# Altium footprint library Common Components.PcbLib: 94 footprints (part 6 of 6)
Each footprint in its own frame and in the unit in brackets; x right, y up, seen from the top. Pads: shape width x height; smd on the part's side, far side on the other; paste and mask are expansions set on the pad; w line width, h text height; cw(c..) or ccw(c..) is an arc to the next point about the centre after c.
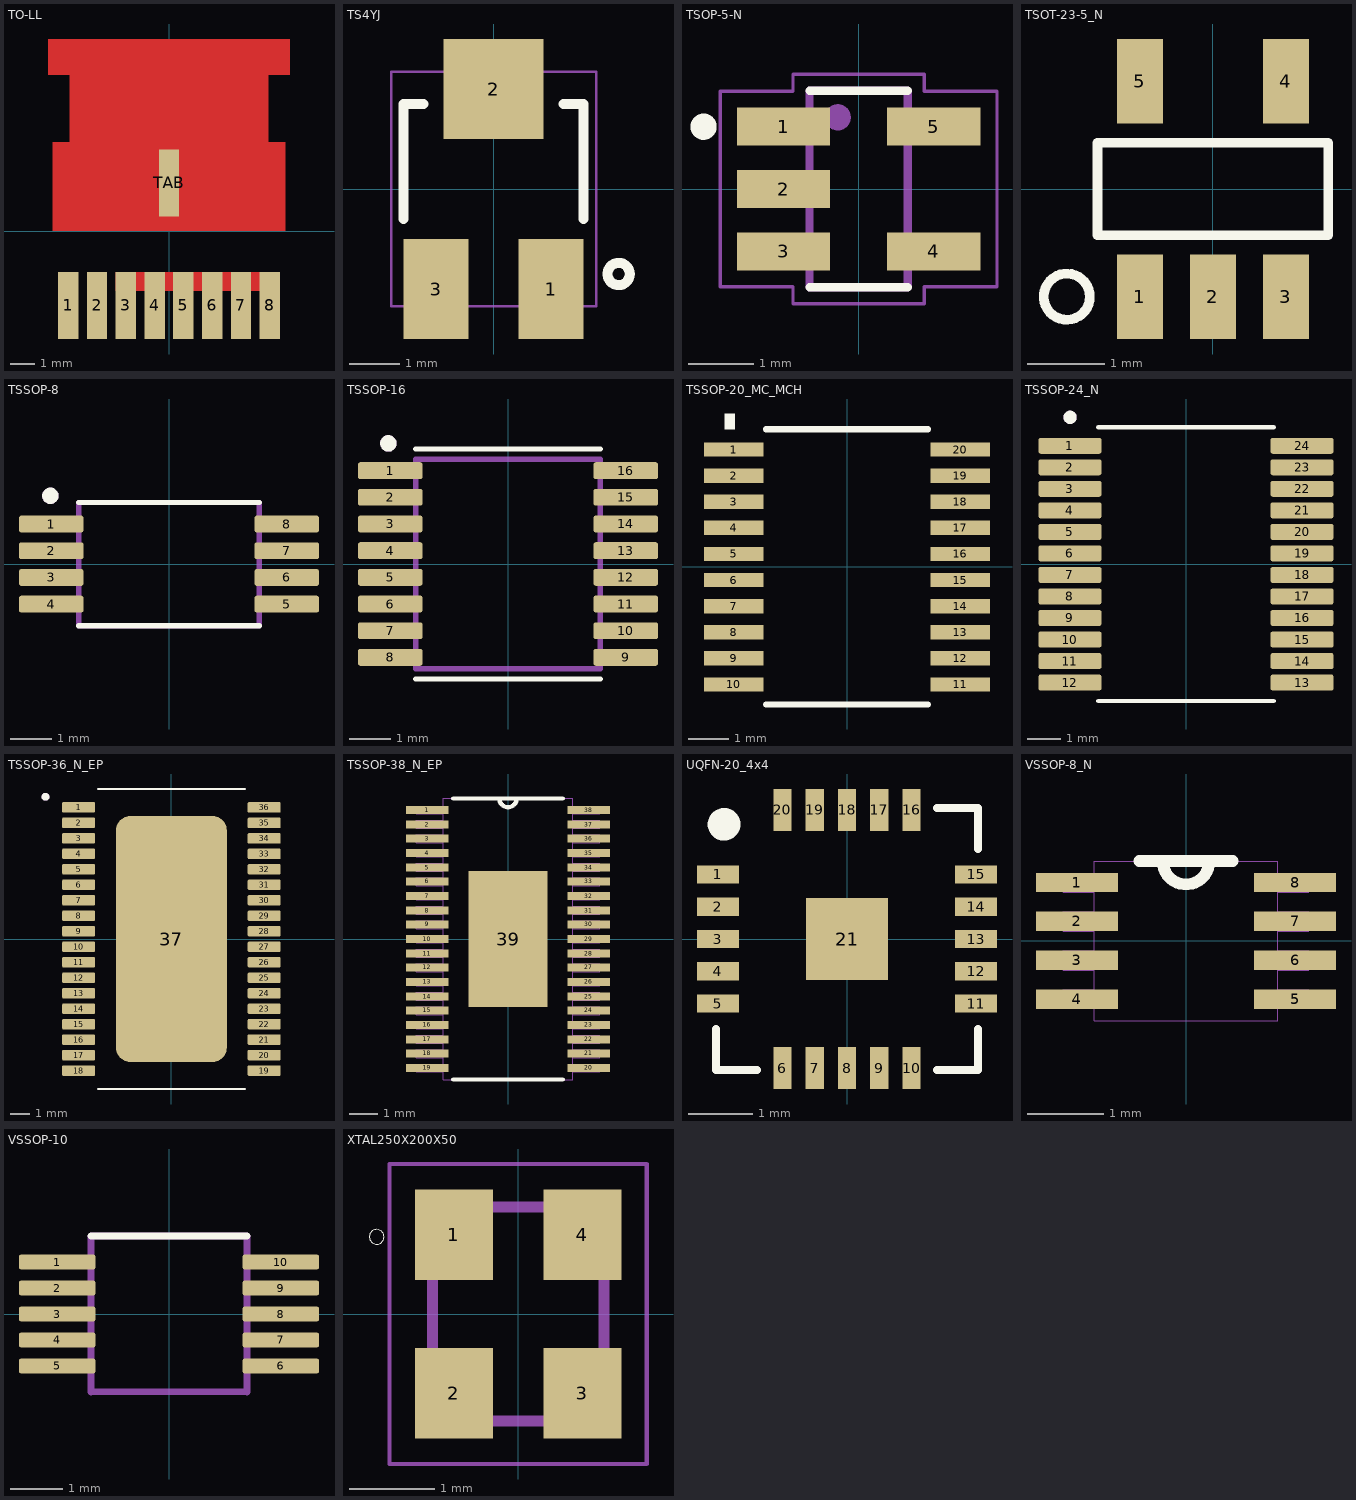
[diagram p5: the footprints below, top view; thin cyan lines are the x and y axes]

## TO-LL [mm]
pads (9):
  rect 0.85x2.8 smd: 1(-4.2,-3.1) 2(-3,-3.1) 3(-1.8,-3.1) 4(-0.6,-3.1) 5(0.6,-3.1) 6(1.8,-3.1) 7(3,-3.1) 8(4.2,-3.1) TAB(0,2)
Top Layer:
  rectangle: -4.15,3 4.15,7
  rectangle: -5.05,6.5 5.05,8
  rectangle: -4.85,0 4.85,3.7
  rectangle: -2.225,-2.5 4.625,-1.7

## TS4YJ [mm]
pads (3):
  rect 1.3x2 smd: 1(1.15,-2) 3(-1.15,-2)
  rect 2x2 smd: 2(0,2)
Top Overlay:
  circle w0.2: c2.5,-1.7 r0.224
  lines w0.2: -1.8,-0.6 -1.8,1.7 -1.4,1.7 ; 1.4,1.7 1.8,1.7 1.8,-0.6
Mechanical 15:
  lines w0.05: -2.05,-2.35 -2.05,2.35 2.05,2.35 2.05,-2.35 -2.05,-2.35
3D body "step_temp.STEP": height 2, standoff 0, extent -1.8,-1.8 1.8,1.8

## TSOP-5-N [mm]
pads (5):
  rect 1.42x0.58 smd: 1(-1.145,0.95) 2(-1.145,0) 3(-1.145,-0.95) 4(1.145,-0.95) 5(1.145,0.95)
Top Overlay:
  circle w0.2: c-2.365,0.95 r0.1
  lines w0.127: -0.75,-1.5 0.75,-1.5 ; -0.75,1.5 0.75,1.5
Mechanical 13:
  circle w0.2: c-0.319,1.093 r0.1
  lines w0.127: -0.75,-1.5 0.75,-1.5 0.75,1.5 -0.75,1.5 -0.75,-1.5
Mechanical 15:
  lines w0.05: -2.11,-1.49 -1,-1.49 -1,-1.75 1,-1.75 1,-1.49 2.11,-1.49 2.11,1.49 1,1.49 1,1.75 -1,1.75 -1,1.49 -2.11,1.49 -2.11,-1.49
3D body "SOT-23-5.step": height 1.11, standoff 0.01, extent -1.25,-1.5 1.25,1.5

## TSOT-23-5_N [mm]
pads (5):
  rect 0.6x1.1 smd: 1(-0.95,-1.4) 2(0,-1.4) 3(0.95,-1.4) 4(0.95,1.4) 5(-0.95,1.4)
Top Overlay:
  circle w0.127: c-1.9,-1.4 r0.3
  lines w0.127: -1.5,-0.6 -1.5,0.6 1.5,0.6 1.5,-0.6 -1.5,-0.6
3D body "TSOT-23-5.step": height 0.95, standoff -0.02, extent -1.45,-1.27 1.45,1.529

## TSSOP-8 [mm]
pads (8):
  rrect25% 1.57x0.41 smd mask+0.15: 1(-2.87,0.975) 2(-2.87,0.325) 3(-2.87,-0.325) 4(-2.87,-0.975) 5(2.87,-0.975) 6(2.87,-0.325) 7(2.87,0.325) 8(2.87,0.975)
Top Overlay:
  circle w0.2: c-2.891,1.664 r0.1
  lines w0.127: -2.2,-1.5 2.2,-1.5 ; -2.2,1.5 2.2,1.5
Mechanical 13:
  circle w0.2: c-2.891,1.664 r0.1
  lines w0.127: -2.2,-1.5 2.2,-1.5 2.2,1.5 -2.2,1.5 -2.2,-1.5
3D body "TSSOP-8.step": height 1.09, standoff 0, extent -3.115,-1.549 3.165,1.451

## TSSOP-16 [mm]
pads (16):
  rrect25% 1.57x0.41 smd mask+0.13: 1(-2.87,2.275) 2(-2.87,1.625) 3(-2.87,0.975) 4(-2.87,0.325) 5(-2.87,-0.325) 6(-2.87,-0.975) 7(-2.87,-1.625) 8(-2.87,-2.275) 9(2.87,-2.275) 10(2.87,-1.625) 11(2.87,-0.975) 12(2.87,-0.325) 13(2.87,0.325) 14(2.87,0.975) 15(2.87,1.625) 16(2.87,2.275)
Top Overlay:
  circle w0.2: c-2.916,2.939 r0.1
  lines w0.127: -2.25,-2.8 2.25,-2.8 ; -2.25,2.8 2.25,2.8
Mechanical 13:
  circle w0.2: c-2.916,2.939 r0.1
  lines w0.127: -2.25,-2.55 2.25,-2.55 2.25,2.55 -2.25,2.55 -2.25,-2.55
3D body "TSSOP-16.step": height 1.1, standoff 0, extent -3.2,-2.5 3.2,2.5

## TSSOP-20_MC_MCH [mil]
pads (20):
  rect 58x14 smd paste+0 mask+0: 1(-111,115.16) 2(-111,89.57) 3(-111,63.98) 4(-111,38.39) 5(-111,12.8) 6(-111,-12.8) 7(-111,-38.39) 8(-111,-63.98) 9(-111,-89.57) 10(-111,-115.16) 11(111,-115.16) 12(111,-89.57) 13(111,-63.98) 14(111,-38.39) 15(111,-12.8) 16(111,12.8) 17(111,38.39) 18(111,63.98) 19(111,89.57) 20(111,115.16)
Top Overlay:
  region: -120,150 -110,150 -110,135 -120,135
  lines w6: -79.42,-135 79.42,-135 ; -79.42,135 79.42,135
3D body "TSSOP20_MC_MCH.step": height 47.09, standoff 0, extent -125.98,-130 125.98,130

## TSSOP-24_N [mm]
pads (24):
  rrect25% 1.9x0.48 smd: 1(-3.505,3.575) 2(-3.505,2.925) 3(-3.505,2.275) 4(-3.505,1.625) 5(-3.505,0.975) 6(-3.505,0.325) 7(-3.505,-0.325) 8(-3.505,-0.975) 9(-3.505,-1.625) 10(-3.505,-2.275) 11(-3.505,-2.925) 12(-3.505,-3.575) 13(3.505,-3.575) 14(3.505,-2.925) 15(3.505,-2.275) 16(3.505,-1.625) 17(3.505,-0.975) 18(3.505,-0.325) 19(3.505,0.325) 20(3.505,0.975) 21(3.505,1.625) 22(3.505,2.275) 23(3.505,2.925) 24(3.505,3.575)
Top Overlay:
  circle w0.2: c-3.5,4.436 r0.1
  lines w0.127: -2.65,-4.135 2.65,-4.135 ; -2.65,4.135 2.65,4.135
Mechanical 13:
  circle w0.2: c-3.5,4.436 r0.1
3D body "TSSOP-24.step": height 1.96, standoff -0.03, extent -3.95,-4.315 3.95,4.315

## TSSOP-36_N_EP [mm]
pads (37):
  rrect25% 1.71x0.54 smd: 1(-4.79,6.8) 2(-4.79,6) 3(-4.79,5.2) 4(-4.79,4.4) 5(-4.79,3.6) 6(-4.79,2.8) 7(-4.79,2) 8(-4.79,1.2) 9(-4.79,0.4) 10(-4.79,-0.4) 11(-4.79,-1.2) 12(-4.79,-2) 13(-4.79,-2.8) 14(-4.79,-3.6) 15(-4.79,-4.4) 16(-4.79,-5.2) 17(-4.79,-6) 18(-4.79,-6.8) 19(4.79,-6.8) 20(4.79,-6) 21(4.79,-5.2) 22(4.79,-4.4) 23(4.79,-3.6) 24(4.79,-2.8) 25(4.79,-2) 26(4.79,-1.2) 27(4.79,-0.4) 28(4.79,0.4) 29(4.79,1.2) 30(4.79,2) 31(4.79,2.8) 32(4.79,3.6) 33(4.79,4.4) 34(4.79,5.2) 35(4.79,6) 36(4.79,6.8)
  rrect25% 5.715x12.7 smd: 37(0,0)
Top Overlay:
  circle w0.2: c-6.5,7.34 r0.1
  lines w0.127: -3.785,-7.745 3.785,-7.745 ; -3.785,7.745 3.785,7.745
Mechanical 13:
  circle w0.2: c-6.5,7.34 r0.1
3D body "TSSOP-36.STEP": height 2.64, standoff 0, extent -5.25,-7.77 5.25,7.77

## TSSOP-38_N_EP [mil]
pads (39):
  rect 58x11 smd: 1(-111,177) 2(-111,157) 3(-111,138) 4(-111,118) 5(-111,98) 6(-111,79) 7(-111,59) 8(-111,39) 9(-111,20) 10(-111,0) 11(-111,-20) 12(-111,-39) 13(-111,-59) 14(-111,-79) 15(-111,-98) 16(-111,-118) 17(-111,-138) 18(-111,-157) 19(-111,-177) 20(111,-177) 21(111,-157) 22(111,-138) 23(111,-118) 24(111,-98) 25(111,-79) 26(111,-59) 27(111,-39) 28(111,-20) 29(111,0) 30(111,20) 31(111,39) 32(111,59) 33(111,79) 34(111,98) 35(111,118) 36(111,138) 37(111,157) 38(111,177)
  rect 108x187 smd: 39(0,0)
Top Overlay:
  lines w6: -75,-193 75,-193 ; -75,193 -12,193 ; 75,193 12,193 ; -12,193 ccw(c0,193) 12,193 ; -12,193 12,193
Mechanical 13:
  drawing of 159 lines, arcs and shapes, not listed
3D body "TSSOP-38.STEP": height 38.3, standoff -0.64, extent -125.98,-190.94 125.99,190.95

## UQFN-20_4x4 [mm]
pads (21):
  rect 0.65x0.285 smd mask+0.127: 1(-2,1) 2(-2,0.5) 3(-2,0) 4(-2,-0.5) 5(-2,-1) 11(2,-1) 12(2,-0.5) 13(2,0) 14(2,0.5) 15(2,1)
  rect 0.285x0.65 smd mask+0.127: 6(-1,-2) 7(-0.5,-2) 8(0,-2) 9(0.5,-2) 10(1,-2) 16(1,2) 17(0.5,2) 18(0,2) 19(-0.5,2) 20(-1,2)
  rect 1.27x1.27 smd: 21(0,0)
Top Overlay:
  circle w0.254: c-1.905,1.778 r0.127
  lines w0.127: -2.032,-1.397 -2.032,-2.032 -1.397,-2.032 ; 1.397,-2.032 2.032,-2.032 2.032,-1.397 ; 1.397,2.032 2.032,2.032 2.032,1.397
3D body "QFN-20_4x4.step": height 0.81, standoff 0.01, extent -2.01,-2.01 2.01,2.01

## VSSOP-8_N [mil]
pads (8):
  rect 42x10 smd: 1(-56,30) 2(-56,10) 3(-56,-10) 4(-56,-30) 5(56,-30) 6(56,-10) 7(56,10) 8(56,30)
Top Overlay:
  lines w6: -24,41 -12,41 ; 24,41 12,41 ; -12,41 ccw(c0,41) 12,41 ; -12,41 12,41
Mechanical 13:
  lines w0: -63,-34 -47,-34 ; -63,-34 -63,-25 ; -63,-34 -47,-34 ; -63,-34 -63,-25 ; -63,-25 -47,-25 ; -63,-25 -47,-25 ; -63,-15 -47,-15 ; -63,-15 -63,-5 ; -63,-15 -47,-15 ; -63,-15 -63,-5 ; -63,-5 -47,-5 ; -63,-5 -47,-5 ; -63,5 -47,5 ; -63,5 -63,15 ; -63,5 -47,5 ; -63,5 -63,15 ; -63,15 -47,15 ; -63,15 -47,15 ; -63,25 -47,25 ; -63,25 -63,34 ; -63,25 -47,25 ; -63,25 -63,34 ; -63,34 -47,34 ; -63,34 -47,34 ; -47,-41 -47,41 ; -47,-41 47,-41 ; -47,-41 -47,41 ; -47,-41 47,-41 ; -47,-34 -47,-25 ; -47,-34 -47,-25 ; -47,-15 -47,-5 ; -47,-15 -47,-5 ; -47,5 -47,15 ; -47,5 -47,15 ; -47,25 -47,34 ; -47,25 -47,34 ; -47,41 -12,41 ; -47,41 -12,41 ; -12,41 ccw(c0,41) 12,41 ; -12,41 ccw(c0,41) 12,41 ; -12,41 12,41 ; -12,41 12,41 ; 12,41 47,41 ; 12,41 47,41 ; 47,-41 47,41 ; 47,-41 47,41 ; 47,-34 63,-34 ; 47,-34 47,-25 ; 47,-34 63,-34 ; 47,-34 47,-25 ; 47,-25 63,-25 ; 47,-25 63,-25 ; 47,-15 63,-15 ; 47,-15 47,-5 ; 47,-15 63,-15 ; 47,-15 47,-5 ; 47,-5 63,-5 ; 47,-5 63,-5 ; 47,5 63,5 ; 47,5 47,15 ; 47,5 63,5 ; 47,5 47,15 ; 47,15 63,15 ; 47,15 63,15 ; 47,25 63,25 ; 47,25 47,34 ; 47,25 63,25 ; 47,25 47,34 ; 47,34 63,34 ; 47,34 63,34 ; 63,-34 63,-25 ; 63,-34 63,-25 ; 63,-15 63,-5 ; 63,-15 63,-5 ; 63,5 63,15 ; 63,5 63,15 ; 63,25 63,34 ; 63,25 63,34
3D body "VSSOP-8.step": height 35.94, standoff 0.5, extent -62.99,-41.35 62.99,41.33

## VSSOP-10 [mm]
pads (10):
  rrect25% 1.47x0.28 smd mask+0.127: 1(-2.15,1) 2(-2.15,0.5) 3(-2.15,0) 4(-2.15,-0.5) 5(-2.15,-1) 6(2.15,-1) 7(2.15,-0.5) 8(2.15,0) 9(2.15,0.5) 10(2.15,1)
Top Overlay:
  lines w0.127: -1.5,1.5 1.5,1.5
Mechanical 1:
  lines w0.127: -1.499,-1.499 1.499,-1.499
Mechanical 13:
  lines w0.127: -1.5,-1.5 -1.5,1.5 1.5,1.5 1.5,-1.5
3D body "step_temp.STEP": height 1.1, standoff 0, extent -2.45,-1.5 2.45,1.5

## XTAL250X200X50 [mm]
pads (4):
  rect 0.91x1.06 smd: 1(-0.75,0.925) 2(-0.75,-0.925) 3(0.75,-0.925) 4(0.75,0.925)
Top Overlay:
  circle w0: c-1.65,0.9 r0.086
Mechanical 13:
  lines w0.127: -1,-1.25 1,-1.25 1,1.25 -1,1.25 -1,-1.25
Mechanical 15:
  lines w0.05: -1.5,-1.75 1.5,-1.75 1.5,1.75 -1.5,1.75 -1.5,-1.75
3D body "XTAL_4SMD_2.5x2.5.STEP": height 0.71, standoff 0.01, extent -1,-1.25 1,1.25